# Altium footprint library Reflow3D1411sep.PcbLib: 657 footprints (part 3 of 42)
Each footprint in its own frame and in the unit in brackets; x right, y up, seen from the top. Pads: shape width x height; smd on the part's side, far side on the other; paste and mask are expansions set on the pad; w line width, h text height; cw(c..) or ccw(c..) is an arc to the next point about the centre after c.
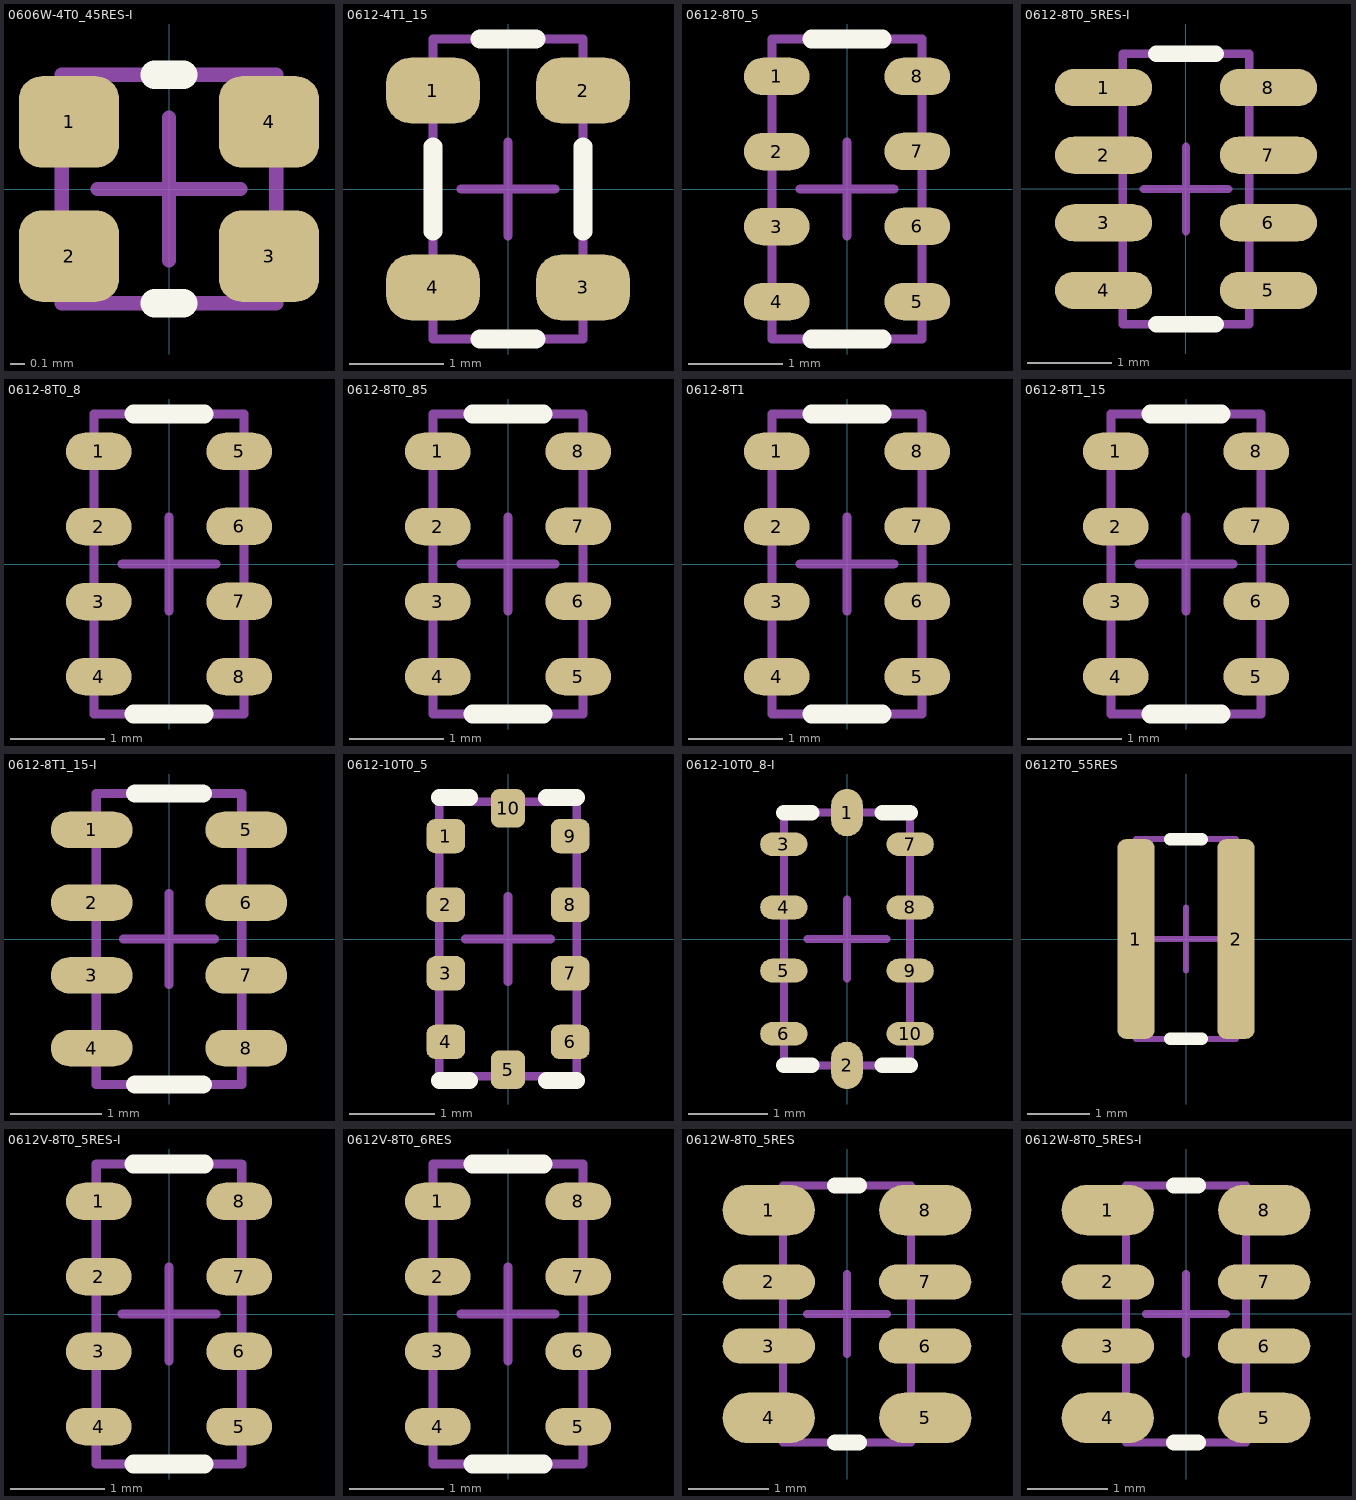
[diagram p2: the footprints below, top view; thin cyan lines are the x and y axes]

## 0606W-4T0_45RES-I [mm] "www.vishay.com, acasat.pdf, ACAS 0606"
height 0.45
pads (4):
  rrect50% 0.7x0.64 smd mask+0.075: 1(-0.7,0.47) 2(-0.7,-0.47) 3(0.7,-0.47) 4(0.7,0.47)
Top Overlay:
  lines w0.2: -0.1,-0.8 0.1,-0.8 ; -0.1,0.8 0.1,0.8
Mechanical 13:
  lines w0.1: -0.75,-0.8 0.75,-0.8 0.75,0.8 -0.75,0.8 -0.75,-0.8
Mechanical 15:
  lines w0.1: -0.5,0 0.5,0 ; 0,-0.5 0,0.5
3D body: height 0.55, standoff 0, extent -0.825,-0.875 0.825,0.875

## 0612-4T1_15 [mm] "www.murata.com, c31e.pdf, DLP31S"
height 1.15
pads (4):
  rrect75% 1x0.7 smd mask+0.075: 1(-0.8,1.05) 2(0.8,1.05) 3(0.8,-1.05) 4(-0.8,-1.05)
Top Overlay:
  lines w0.2: -0.8,-0.45 -0.8,0.45 ; -0.3,-1.6 0.3,-1.6 ; -0.3,1.6 0.3,1.6 ; 0.8,-0.45 0.8,0.45
Mechanical 13:
  lines w0.1: -0.8,-1.6 0.8,-1.6 0.8,1.6 -0.8,1.6 -0.8,-1.6
Mechanical 15:
  lines w0.1: -0.5,0 0.5,0 ; 0,-0.5 0,0.5
3D body: height 1.3, standoff 0, extent -0.875,-1.675 0.875,1.675

## 0612-8T0_5 [mm] "www.murata.com, c02e.pdf, LLA315"
height 0.5
pads (8):
  oval 0.7x0.4 smd mask+0.075: 1(-0.75,1.2) 2(-0.75,0.4) 3(-0.75,-0.4) 4(-0.75,-1.2) 5(0.75,-1.2) 6(0.75,-0.4) 7(0.75,0.4) 8(0.75,1.2)
Top Overlay:
  lines w0.2: -0.375,-1.6 0.375,-1.6 ; -0.375,1.6 0.375,1.6
Mechanical 13:
  lines w0.1: -0.8,-1.6 -0.8,1.6 0.8,1.6 0.8,-1.6 -0.8,-1.6
Mechanical 15:
  lines w0.1: -0.5,0 0.5,0 ; 0,-0.5 0,0.5
3D body: height 0.55, standoff 0, extent -0.875,-1.675 0.875,1.675

## 0612-8T0_5RES-I [mm] "www.vishay.com, cra06es.pdf, E-Version"
height 0.5
pads (8):
  oval 1.15x0.44 smd mask+0.075: 1(-0.975,1.2) 2(-0.975,0.4) 3(-0.975,-0.4) 4(-0.975,-1.2) 5(0.975,-1.2) 6(0.975,-0.4) 7(0.975,0.4) 8(0.975,1.2)
Top Overlay:
  lines w0.2: -0.35,-1.6 0.35,-1.6 ; -0.35,1.6 0.35,1.6
Mechanical 13:
  lines w0.1: -0.75,-1.6 -0.75,1.6 0.75,1.6 0.75,-1.6 -0.75,-1.6
Mechanical 15:
  lines w0.1: -0.5,0 0.5,0 ; 0,-0.5 0,0.5
3D body: height 0.6, standoff 0, extent -0.825,-1.675 0.825,1.675

## 0612-8T0_8 [mm] "www.murata.com, c31e.pdf, BLA31A/BLA31B"
height 0.8
pads (8):
  oval 0.7x0.4 smd mask+0.075: 1(-0.75,1.2) 2(-0.75,0.4) 3(-0.75,-0.4) 4(-0.75,-1.2) 5(0.75,1.2) 6(0.75,0.4) 7(0.75,-0.4) 8(0.75,-1.2)
Top Overlay:
  lines w0.2: -0.375,-1.6 0.375,-1.6 ; -0.375,1.6 0.375,1.6
Mechanical 13:
  lines w0.1: -0.8,-1.6 -0.8,1.6 0.8,1.6 0.8,-1.6 -0.8,-1.6
Mechanical 15:
  lines w0.1: -0.5,0 0.5,0 ; 0,-0.5 0,0.5
3D body: height 1, standoff 0, extent -0.9,-1.7 0.9,1.7

## 0612-8T0_85 [mm] "www.murata.com, c02e.pdf, GNM314"
height 0.85
pads (8):
  oval 0.7x0.4 smd mask+0.075: 1(-0.75,1.2) 2(-0.75,0.4) 3(-0.75,-0.4) 4(-0.75,-1.2) 5(0.75,-1.2) 6(0.75,-0.4) 7(0.75,0.4) 8(0.75,1.2)
Top Overlay:
  lines w0.2: -0.375,-1.6 0.375,-1.6 ; -0.375,1.6 0.375,1.6
Mechanical 13:
  lines w0.1: -0.8,-1.6 0.8,-1.6 0.8,1.6 -0.8,1.6 -0.8,-1.6
Mechanical 15:
  lines w0.1: -0.5,0 0.5,0 ; 0,-0.5 0,0.5
3D body: height 0.95, standoff 0, extent -0.875,-1.675 0.875,1.675

## 0612-8T1 [mm] "www.murata.com, c02e.pdf, GNM314"
height 1
pads (8):
  oval 0.7x0.4 smd mask+0.075: 1(-0.75,1.2) 2(-0.75,0.4) 3(-0.75,-0.4) 4(-0.75,-1.2) 5(0.75,-1.2) 6(0.75,-0.4) 7(0.75,0.4) 8(0.75,1.2)
Top Overlay:
  lines w0.2: -0.375,-1.6 0.375,-1.6 ; -0.375,1.6 0.375,1.6
Mechanical 13:
  lines w0.1: -0.8,-1.6 -0.8,1.6 0.8,1.6 0.8,-1.6 -0.8,-1.6
Mechanical 15:
  lines w0.1: -0.5,0 0.5,0 ; 0,-0.5 0,0.5
3D body: height 1.1, standoff 0, extent -0.875,-1.675 0.875,1.675

## 0612-8T1_15 [mm] "www.murata.com, c02e.pdf, GNM314"
height 1.15
pads (8):
  oval 0.7x0.4 smd mask+0.075: 1(-0.75,1.2) 2(-0.75,0.4) 3(-0.75,-0.4) 4(-0.75,-1.2) 5(0.75,-1.2) 6(0.75,-0.4) 7(0.75,0.4) 8(0.75,1.2)
Top Overlay:
  lines w0.2: -0.375,-1.6 0.375,-1.6 ; -0.375,1.6 0.375,1.6
Mechanical 13:
  lines w0.1: -0.8,-1.6 -0.8,1.6 0.8,1.6 0.8,-1.6 -0.8,-1.6
Mechanical 15:
  lines w0.1: -0.5,0 0.5,0 ; 0,-0.5 0,0.5
3D body: height 1.25, standoff 0, extent -0.875,-1.675 0.875,1.675

## 0612-8T1_15-I [mm] "www.murata.com, c31e.pdf, DLP31D"
height 1.15
pads (8):
  oval 0.9x0.4 smd paste-25.4 mask+0.075: 1(-0.85,1.2) 2(-0.85,0.4) 3(-0.85,-0.4) 4(-0.85,-1.2) 5(0.85,1.2) 6(0.85,0.4) 7(0.85,-0.4) 8(0.85,-1.2)
Top Overlay:
  lines w0.2: -0.375,-1.6 0.375,-1.6 ; -0.375,1.6 0.375,1.6
Top Paste:
  region: 1.4,0.2 1.4,0.6 0.4,0.6 0.4,0.2
  region: 1.4,1 1.4,1.4 0.4,1.4 0.4,1
  region: 1.4,-0.6 1.4,-0.2 0.4,-0.2 0.4,-0.6
  region: 1.4,-1.4 1.4,-1 0.4,-1 0.4,-1.4
  region: -0.4,-1.4 -0.4,-1 -1.4,-1 -1.4,-1.4
  region: -0.4,-0.6 -0.4,-0.2 -1.4,-0.2 -1.4,-0.6
  region: -0.4,0.2 -0.4,0.6 -1.4,0.6 -1.4,0.2
  region: -0.4,1 -0.4,1.4 -1.4,1.4 -1.4,1
Mechanical 13:
  lines w0.1: -0.8,-1.6 -0.8,1.6 0.8,1.6 0.8,-1.6 -0.8,-1.6
Mechanical 15:
  lines w0.1: -0.5,0 0.5,0 ; 0,-0.5 0,0.5
3D body: height 1.3, standoff 0, extent -0.875,-1.675 0.875,1.675

## 0612-10T0_5 [mm] "www.murata.com, c02e.pdf, LLM315"
height 0.5
pads (10):
  rrect50% 0.45x0.4 smd mask+0.075: 1(-0.725,1.2) 2(-0.725,0.4) 3(-0.725,-0.4) 4(-0.725,-1.2) 6(0.725,-1.2) 7(0.725,-0.4) 8(0.725,0.4) 9(0.725,1.2)
  rrect50% 0.4x0.45 smd mask+0.075: 5(0,-1.525) 10(0,1.525)
Top Overlay:
  lines w0.2: -0.8,-1.65 -0.45,-1.65 ; -0.8,1.65 -0.45,1.65 ; 0.45,-1.65 0.8,-1.65 ; 0.45,1.65 0.8,1.65
Mechanical 13:
  lines w0.1: -0.8,-1.6 -0.8,1.6 0.8,1.6 0.8,-1.6 -0.8,-1.6
Mechanical 15:
  lines w0.1: -0.5,0 0.5,0 ; 0,-0.5 0,0.5
3D body: height 0.55, standoff 0, extent -0.875,-1.675 0.875,1.675

## 0612-10T0_8-I [mm] "www.murata.com, c31e.pdf, NFA31C"
height 0.8
pads (10):
  oval 0.4x0.6 smd mask+0.075: 1(0,1.6) 2(0,-1.6)
  oval 0.6x0.3 smd mask+0.075: 3(-0.8,1.2) 4(-0.8,0.4) 5(-0.8,-0.4) 6(-0.8,-1.2) 7(0.8,1.2) 8(0.8,0.4) 9(0.8,-0.4) 10(0.8,-1.2)
Top Overlay:
  lines w0.2: -0.8,-1.6 -0.45,-1.6 ; -0.8,1.6 -0.45,1.6 ; 0.45,-1.6 0.8,-1.6 ; 0.45,1.6 0.8,1.6
Mechanical 13:
  lines w0.1: -0.8,-1.6 -0.8,1.6 0.8,1.6 0.8,-1.6 -0.8,-1.6
Mechanical 15:
  lines w0.1: -0.5,0 0.5,0 ; 0,-0.5 0,0.5
3D body: height 1, standoff 0, extent -0.9,-1.7 0.9,1.7

## 0612T0_55RES [mm] "www.vishay.com, rcle3.pdf"
height 0.55
pads (2):
  rrect50% 0.6x3.2 smd mask+0.075: 1(-0.8,0) 2(0.8,0)
Top Overlay:
  lines w0.2: -0.25,-1.6 0.25,-1.6 ; -0.25,1.6 0.25,1.6
Mechanical 13:
  lines w0.1: -0.8,-1.6 0.8,-1.6 0.8,1.6 -0.8,1.6 -0.8,-1.6
Mechanical 15:
  lines w0.1: -0.5,0 0.5,0 ; 0,-0.5 0,0.5
3D body: height 0.65, standoff 0, extent -0.9,-1.7 0.9,1.7

## 0612V-8T0_5RES-I [mm] "www.bourns.com, CATCAY.pdf, CAT16-F4"
height 0.5
pads (8):
  oval 0.7x0.4 smd mask+0.075: 1(-0.75,1.2) 2(-0.75,0.4) 3(-0.75,-0.4) 4(-0.75,-1.2) 5(0.75,-1.2) 6(0.75,-0.4) 7(0.75,0.4) 8(0.75,1.2)
Top Overlay:
  lines w0.2: -0.375,-1.6 0.375,-1.6 ; -0.375,1.6 0.375,1.6
Mechanical 13:
  lines w0.1: -0.775,-1.6 0.775,-1.6 0.775,1.6 -0.775,1.6 -0.775,-1.6
Mechanical 15:
  lines w0.1: -0.5,0 0.5,0 ; 0,-0.5 0,0.5
3D body: height 0.6, standoff 0, extent -0.9,-1.7 0.9,1.7

## 0612V-8T0_6RES [mm] "www.bourns.com, CAT16LV2F6.pdf"
height 0.6
pads (8):
  oval 0.7x0.4 smd mask+0.075: 1(-0.75,1.2) 2(-0.75,0.4) 3(-0.75,-0.4) 4(-0.75,-1.2) 5(0.75,-1.2) 6(0.75,-0.4) 7(0.75,0.4) 8(0.75,1.2)
Top Overlay:
  lines w0.2: -0.375,-1.6 0.375,-1.6 ; -0.375,1.6 0.375,1.6
Mechanical 13:
  lines w0.1: -0.8,-1.6 0.8,-1.6 0.8,1.6 -0.8,1.6 -0.8,-1.6
Mechanical 15:
  lines w0.1: -0.5,0 0.5,0 ; 0,-0.5 0,0.5
3D body: height 0.7, standoff 0, extent -0.875,-1.675 0.875,1.675

## 0612W-8T0_5RES [mm] "www.vishay.com, cra06es.pdf; www.bourns.com, CATCAY.pdf, CAY16-F4"
height 0.5
pads (8):
  oval 1.15x0.63 smd mask+0.075: 1(-0.975,1.295) 4(-0.975,-1.295) 5(0.975,-1.295) 8(0.975,1.295)
  oval 1.15x0.44 smd mask+0.075: 2(-0.975,0.4) 3(-0.975,-0.4) 6(0.975,-0.4) 7(0.975,0.4)
Top Overlay:
  lines w0.2: -0.15,-1.6 0.15,-1.6 ; -0.15,1.6 0.15,1.6
Mechanical 13:
  lines w0.1: -0.8,-1.6 -0.8,1.6 0.8,1.6 0.8,-1.6 -0.8,-1.6
Mechanical 15:
  lines w0.1: -0.5,0 0.5,0 ; 0,-0.5 0,0.5
3D body: height 0.6, standoff 0, extent -0.9,-1.7 0.9,1.7

## 0612W-8T0_5RES-I [mm] "www.vishay.com, cra06es.pdf, S-Version"
height 0.5
pads (8):
  oval 1.15x0.63 smd mask+0.075: 1(-0.975,1.295) 4(-0.975,-1.295) 5(0.975,-1.295) 8(0.975,1.295)
  oval 1.15x0.44 smd mask+0.075: 2(-0.975,0.4) 3(-0.975,-0.4) 6(0.975,-0.4) 7(0.975,0.4)
Top Overlay:
  lines w0.2: -0.15,-1.6 0.15,-1.6 ; -0.15,1.6 0.15,1.6
Mechanical 13:
  lines w0.1: -0.75,-1.6 0.75,-1.6 0.75,1.6 -0.75,1.6 -0.75,-1.6
Mechanical 15:
  lines w0.1: -0.5,0 0.5,0 ; 0,-0.5 0,0.5
3D body: height 0.6, standoff 0, extent -0.825,-1.675 0.825,1.675